# Altium footprint library Derogarian_Library.PcbLib: 94 footprints (part 5 of 6)
Each footprint in its own frame and in the unit in brackets; x right, y up, seen from the top. Pads: shape width x height; smd on the part's side, far side on the other; paste and mask are expansions set on the pad; w line width, h text height; cw(c..) or ccw(c..) is an arc to the next point about the centre after c.
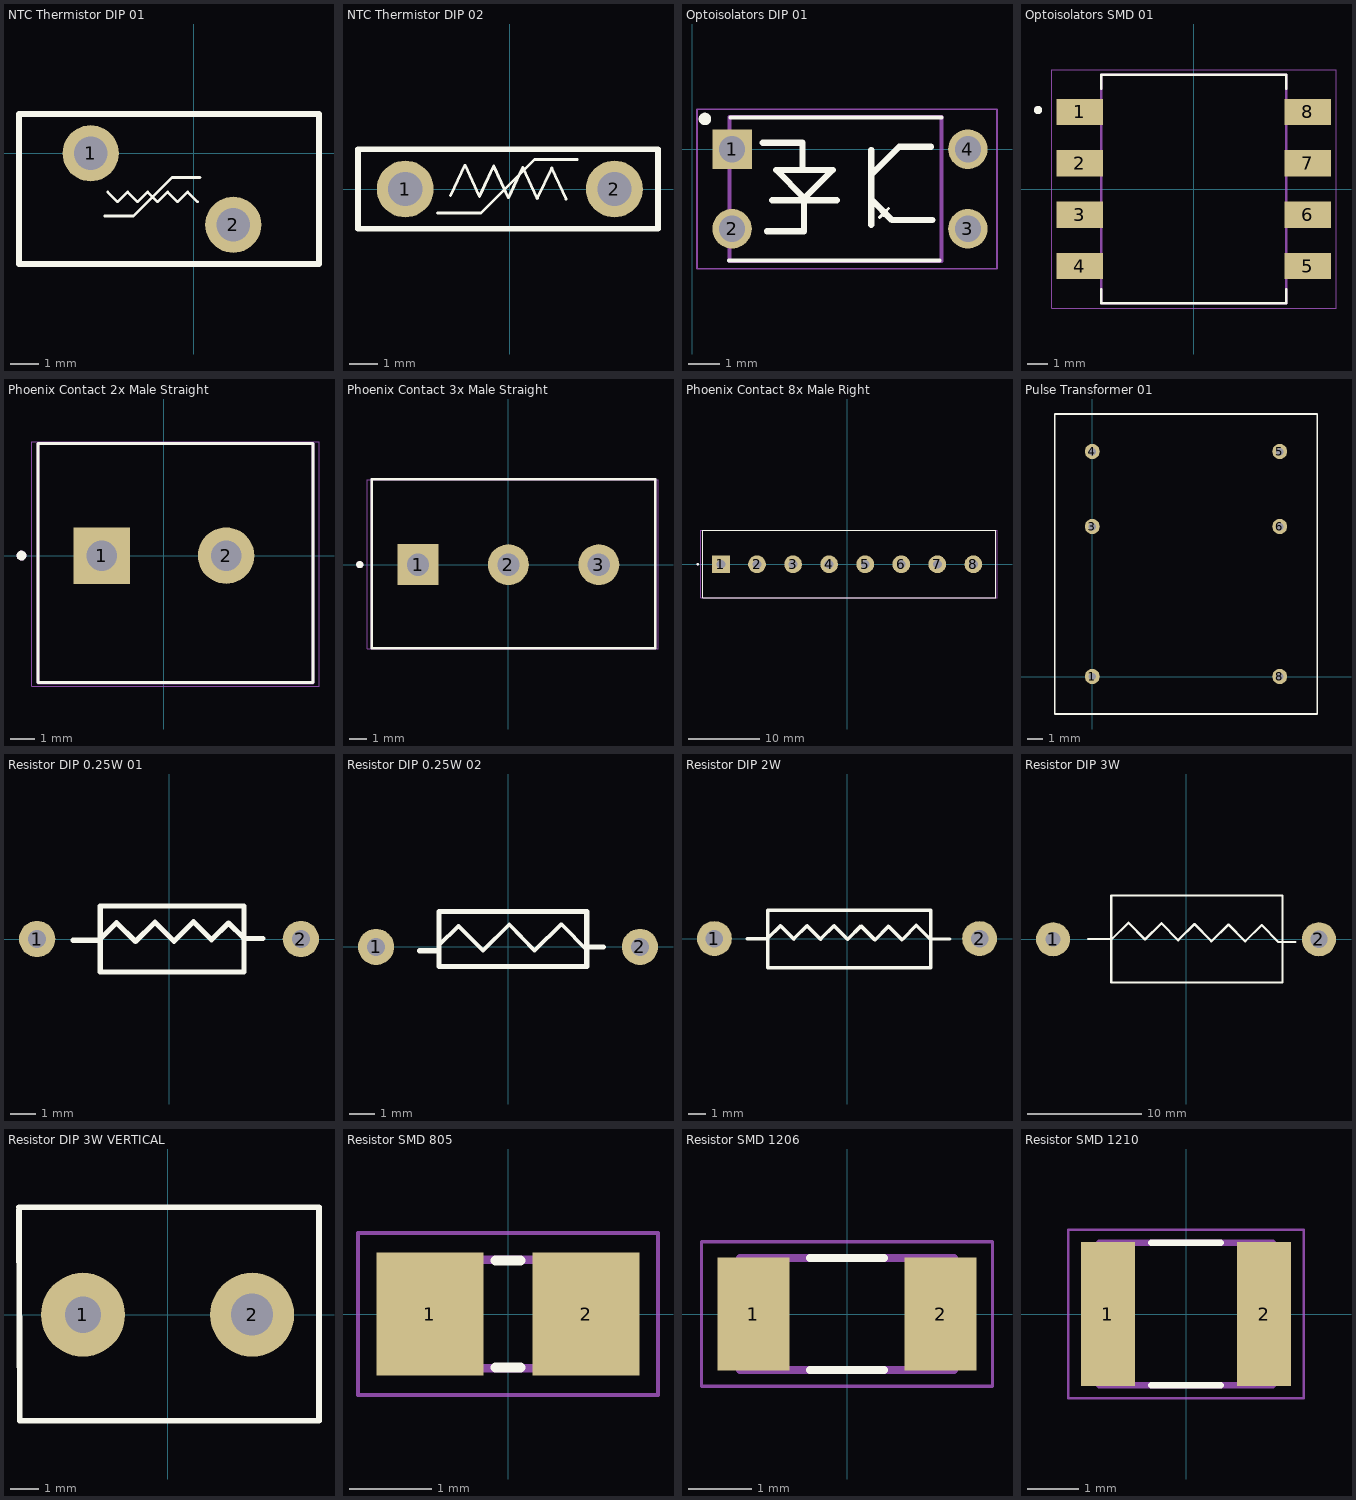
[diagram p4: the footprints below, top view; thin cyan lines are the x and y axes]

## NTC Thermistor DIP 01 [mm]
pads (2):
  round 2 hole 1.2: 1(-3.674,0) 2(1.397,-2.54)
Top Overlay:
  lines w0.095: -3.072,-1.371 -2.719,-1.724 ; -2.717,-1.726 -2.363,-1.373 ; -2.361,-1.371 -2.008,-1.724 ; -2.006,-1.726 -1.652,-1.373 ; -1.649,-1.372 -1.295,-1.725 ; -1.294,-1.726 -0.941,-1.373 ; -0.938,-1.372 -0.584,-1.725 ; -0.583,-1.726 -0.23,-1.373 ; -0.227,-1.372 0.127,-1.725
  lines w0.1: -3.176,-2.234 -2.157,-2.234 -0.787,-0.863 0.213,-0.863
  lines w0.2: -6.223,-3.937 -6.223,1.4 4.445,1.4 4.445,-3.937 -6.223,-3.937
3D body "User Library-SL08-20002.STEP": height 11.8, standoff -3, extent -5.643,-3.411 3.357,0.889

## NTC Thermistor DIP 02 [mm]
pads (2):
  round 2 hole 1.2: 1(-3.674,0) 2(3.675,0)
Top Overlay:
  lines w0.1: -2.54,-0.838 -1.008,-0.838 0.872,1.041 2.372,1.041 ; -2.079,-0.224 -1.579,0.834 ; -1.571,0.834 -1.071,-0.259 ; -1.063,-0.25 -0.563,0.809 ; -0.555,0.783 -0.055,-0.31 ; -0.047,-0.301 0.453,0.758 ; 0.461,0.758 0.961,-0.335 ; 0.969,-0.326 1.469,0.732 ; 1.477,0.732 1.977,-0.36
  lines w0.2: -5.334,-1.4 -5.334,1.4 5.207,1.4 5.207,-1.4 -5.334,-1.4
3D body "User Library-RES_NTC-B57237S0509M0-THT_1500_0700_2200.STEP": height 21.1, standoff -4.5, extent -7.38,-3.444 7.62,3.556

## Optoisolators DIP 01 [mm]
pads (4):
  rect 1.26x1.26 hole 0.84: 1(1.27,0)
  round 1.26 hole 0.84: 2(1.27,-2.54) 3(8.8,-2.54) 4(8.8,0)
Top Overlay:
  circle w0.2: c0.406,0.965 r0.1
  lines w0.1: 5.98,-2.173 6.121,-2.032 ; 5.996,-1.906 6.121,-2.032 ; 6.051,-2.103 6.266,-2.17 6.192,-1.961 ; 6.263,-1.891 6.121,-2.032
  lines w0.127: 1.168,-3.556 7.899,-3.556 ; 1.219,1.016 7.95,1.016
  lines w0.2: 2.248,0.203 3.518,0.203 3.518,-0.635 3.492,-0.66 4.483,-0.66 ; 2.388,-2.616 3.569,-2.616 3.569,-1.524 ; 2.553,-1.626 4.61,-1.626 ; 7.62,0.076 6.604,0.076 5.715,-0.813 5.715,-0.025 5.715,-2.413 5.715,-1.6 6.375,-2.261 7.671,-2.261 ; 4.483,-0.66 3.581,-1.562 2.68,-0.66 4.483,-0.66
Mechanical 13:
  lines w0.127: 1.194,-3.57 7.95,-3.57 7.95,1.03 1.194,1.03 1.194,-3.57
Mechanical 15:
  lines w0.05: 0.152,-3.82 9.728,-3.82 9.728,1.28 0.152,1.28 0.152,-3.82
3D body "User Library-DIP4-7_62-2_54.STEP": height 4.3, standoff -2.7, extent 1.089,-3.667 8.969,0.924

## Optoisolators SMD 01 [mm]
pads (8):
  rect 2.29x1.3 smd: 1(-5.635,3.81) 2(-5.635,1.27) 3(-5.635,-1.27) 4(-5.635,-3.81) 5(5.635,-3.81) 6(5.635,-1.27) 7(5.635,1.27) 8(5.635,3.81)
Top Overlay:
  circle w0.2: c-7.7,3.9 r0.1
  lines w0.127: -4.575,-4.95 -4.575,-5.65 4.575,-5.65 4.575,-4.95 ; -4.575,4.95 -4.575,5.65 4.575,5.65 4.575,4.95
Mechanical 13:
  circle w0.2: c-7.7,3.9 r0.1
  lines w0.127: -4.575,-5.65 -4.575,5.65 4.575,5.65 4.575,-5.65 -4.575,-5.65
Mechanical 15:
  lines w0.05: -7.03,-5.9 -7.03,5.9 7.03,5.9 7.03,-5.9 -7.03,-5.9
3D body "HCNR200-500E.STEP": height 5, standoff 0, extent -6.19,-5.575 6.11,5.575

## Phoenix Contact 2x Male Straight [mm]
pads (2):
  rect 2.3x2.3 hole 1.25: 1(-2.54,0)
  round 2.3 hole 1.25: 2(2.54,0)
Top Overlay:
  circle w0.2: c-5.815,0 r0.1
  lines w0.127: -5.14,-5.182 6.08,-5.182 6.08,4.572 -5.14,4.572 -5.14,-5.182
Mechanical 13:
  circle w0.2: c-5.815,0 r0.1
  lines w0.127: -5.14,-5.207 6.08,-5.207 6.08,4.572 -5.14,4.572 -5.14,-5.207
Mechanical 15:
  lines w0.05: -5.39,-5.334 6.33,-5.334 6.33,4.648 -5.39,4.648 -5.39,-5.334
3D body "1715721.stp": height 14.7, standoff -3, extent -5.019,-5.253 5.882,4.547

## Phoenix Contact 3x Male Straight [mm]
pads (3):
  rect 2.3x2.3 hole 1.25: 1(-5.08,0)
  round 2.3 hole 1.25: 2(0,0) 3(5.08,0)
Top Overlay:
  circle w0.2: c-8.355,0 r0.1
  lines w0.127: -7.68,-4.699 8.255,-4.699 8.255,4.801 -7.68,4.801 -7.68,-4.699
Mechanical 13:
  circle w0.2: c-8.355,0 r0.1
  lines w0.127: -7.68,-4.699 -7.68,4.801 8.255,4.801 8.255,-4.699 -7.68,-4.699
Mechanical 15:
  lines w0.05: -7.93,-4.724 8.407,-4.724 8.407,4.775 -7.93,4.775 -7.93,-4.724
3D body "User Library-1888690_02.STEP": height 15.5, standoff -3, extent -7.626,-4.725 8.184,4.775

## Phoenix Contact 8x Male Right [mm]
pads (8):
  rect 2.5x2.5 hole 1.25: 1(-17.78,0)
  round 2.5 hole 1.25: 2(-12.7,0) 3(-7.62,0) 4(-2.54,0) 5(2.54,0) 6(7.62,0) 7(12.7,0) 8(17.78,0)
Top Overlay:
  circle w0.2: c-21.055,0 r0.1
  lines w0.127: -20.38,-4.699 20.955,-4.699 20.955,4.801 -20.38,4.801 -20.38,-4.699
Mechanical 13:
  circle w0.2: c-21.055,0 r0.1
  lines w0.127: -20.38,-4.699 -20.38,4.801 20.955,4.801 20.955,-4.699 -20.38,-4.699
Mechanical 15:
  lines w0.05: -20.63,-4.724 -20.63,4.775 21.107,4.775 21.107,-4.724 -20.63,-4.724
3D body "1715789.stp": height 14.7, standoff -3, extent -21.046,-4.572 20.335,5.228

## Pulse Transformer 01 [mm]
pads (6):
  round 1 hole 0.5: 1(0,0) 3(0,10) 4(0,15) 5(12.5,15) 6(12.5,10) 8(12.5,0)
Top Overlay:
  lines w0.1: -2.5,-2.5 -2.5,17.5 ; 15,-2.5 15,17.5
  lines w0.127: -2.5,-2.5 15,-2.5 ; -2.5,17.5 15,17.5

## Resistor DIP 0.25W 01 [mm]
height 2.54
pads (2):
  round 1.4 hole 0.7: 1(-5.093,0) 2(5.093,0)
Top Overlay:
  lines w0.2: -3.696,-0.051 -2.705,-0.051 -2.026,0.629 -1.295,-0.102 -0.546,0.648 0.191,-0.089 0.946,0.667 1.645,-0.032 2.299,0.622 2.896,0.025 ; 2.883,0.025 3.632,0.025 ; -2.654,-1.27 -2.654,1.27 2.896,1.27 2.896,-1.27 -2.654,-1.27
3D body "User Library-RESISTOR, 0_25 W, 0_4 IN LEAD PITCH.STEP": height 2.93, standoff -2.54, extent -5.397,-1.156 5.372,1.156

## Resistor DIP 0.25W 02 [mm]
height 2.54
pads (2):
  round 1.4 hole 0.7: 1(-5.105,0) 2(5.105,0)
Top Overlay:
  lines w0.15: -2.687,0.046 -1.914,0.801 -0.968,-0.145 0.048,0.871 1.03,-0.136 2.069,0.877 3.073,-0.152
  lines w0.2: -3.421,-0.152 -2.684,-0.152 ; 3.048,0 3.687,0 ; -2.667,-0.762 -2.667,1.372 3.048,1.372 3.048,-0.762 -2.667,-0.762
3D body "User Library-Res40-Axial 0_25W-3_3K.STEP": height 2.71, standoff -1.7, extent -5.329,-1.232 5.431,1.168

## Resistor DIP 2W [mm]
height 5.08
pads (2):
  round 2 hole 1: 1(-7.607,0) 2(7.607,0)
Top Overlay:
  lines w0.2: -5.728,0 -4.559,0 ; -4.578,-0.019 -3.816,0.743 -3.042,-0.032 ; -3.054,-0.019 -2.292,0.743 -1.518,-0.032 ; -1.505,-0.019 -0.743,0.743 0.032,-0.032 ; 0.044,-0.044 0.806,0.718 1.581,-0.057 ; 1.619,-0.059 2.381,0.703 3.155,-0.072 ; 3.219,-0.008 3.981,0.754 4.755,-0.021 ; 4.788,-0.025 5.905,-0.025 ; -4.559,-1.651 -4.559,1.626 4.801,1.626 4.801,-1.676 -4.534,-1.676 -4.559,-1.651
3D body "User Library-PR02.STEP": height 4.25, standoff -8.13, extent -7.982,-1.97 8.058,1.93

## Resistor DIP 3W [mm]
height 7.62
pads (2):
  round 3 hole 1.3: 1(-11.671,0)
  round 3 hole 1.5: 2(11.671,0)
Top Overlay:
  lines w0.2: -8.598,0.025 -6.693,0.025 ; -6.565,-0.039 -5.049,1.45 -3.596,-0.028 -2.144,1.4 -0.692,-0.078 ; -0.701,-0.079 0.752,1.349 2.203,-0.129 ; 2.224,-0.191 3.739,1.298 5.192,-0.18 6.644,1.247 8.095,-0.229 9.588,-0.229 ; -6.566,-3.785 -6.566,3.835 8.471,3.835 8.471,-3.785 -6.566,-3.785
3D body "User Library-PR03.STEP": height 7.2, standoff -5.9, extent -11.893,-2.635 11.766,2.565

## Resistor DIP 3W VERTICAL [mm]
height 7.62
pads (2):
  round 3 hole 1.3: 1(-3.023,0)
  round 3 hole 1.5: 2(3.023,0)
Top Overlay:
  lines w0.2: -5.309,3.734 -5.283,-3.785 5.41,-3.785 5.41,3.835 -5.309,3.835
3D body "User Library-AXIAL_RESISTOR(3W_VERT).STEP": height 23.55, standoff -2.6, extent -3.565,-3.196 4.835,3.404

## Resistor SMD 805 [mm]
pads (2):
  rect 1.3x1.5 smd: 1(-0.95,0) 2(0.95,0)
Top Overlay:
  lines w0.127: -0.15,-0.65 0.15,-0.65 ; -0.15,0.65 0.15,0.65
Mechanical 13:
  region: 1.106,-0.725 0.356,-0.725 0.356,0.726 1.106,0.726
  region: -0.342,-0.725 -1.094,-0.725 -1.094,0.726 -0.342,0.726
  lines w0.102: -0.381,0.66 0.381,0.66 ; -0.356,-0.66 0.381,-0.66
Mechanical 15:
  lines w0.051: -1.823,-0.983 -1.823,0.983 1.823,0.983 1.823,-0.983 -1.823,-0.983
3D body "step_temp.STEP": height 0.6, standoff 0, extent -1,-0.625 1,0.625

## Resistor SMD 1206 [mm]
pads (2):
  rect 1.13x1.77 smd: 1(-1.47,0) 2(1.47,0)
Top Overlay:
  lines w0.127: -0.58,-0.88 0.58,-0.88 ; -0.58,0.88 0.58,0.88
Mechanical 13:
  lines w0.127: -1.68,-0.88 -1.68,0.88 1.68,0.88 1.68,-0.88 -1.68,-0.88
Mechanical 15:
  lines w0.05: -2.285,-1.135 -2.285,1.135 2.285,1.135 2.285,-1.135 -2.285,-1.135
3D body "User Library-RESC3216X06N.STEP": height 0.55, standoff 0, extent -1.625,-0.774 1.575,0.826

## Resistor SMD 1210 [mm]
pads (2):
  rect 1.06x2.82 smd: 1(-1.528,0) 2(1.528,0)
Top Overlay:
  lines w0.127: -0.68,-1.4 0.68,-1.4 ; -0.68,1.4 0.68,1.4
Mechanical 13:
  lines w0.127: -1.7,-1.4 -1.7,1.4 1.7,1.4 1.7,-1.4 -1.7,-1.4
Mechanical 15:
  lines w0.05: -2.308,-1.65 -2.308,1.65 2.308,1.65 2.308,-1.65 -2.308,-1.65
3D body "User Library-RESC3225X06N.STEP": height 0.55, standoff 0, extent -1.625,-1.199 1.575,1.301